# Altium footprint library connectors.PcbLib: 256 footprints (part 14 of 16)
Each footprint in its own frame and in the unit in brackets; x right, y up, seen from the top. Pads: shape width x height; smd on the part's side, far side on the other; paste and mask are expansions set on the pad; w line width, h text height; cw(c..) or ccw(c..) is an arc to the next point about the centre after c.
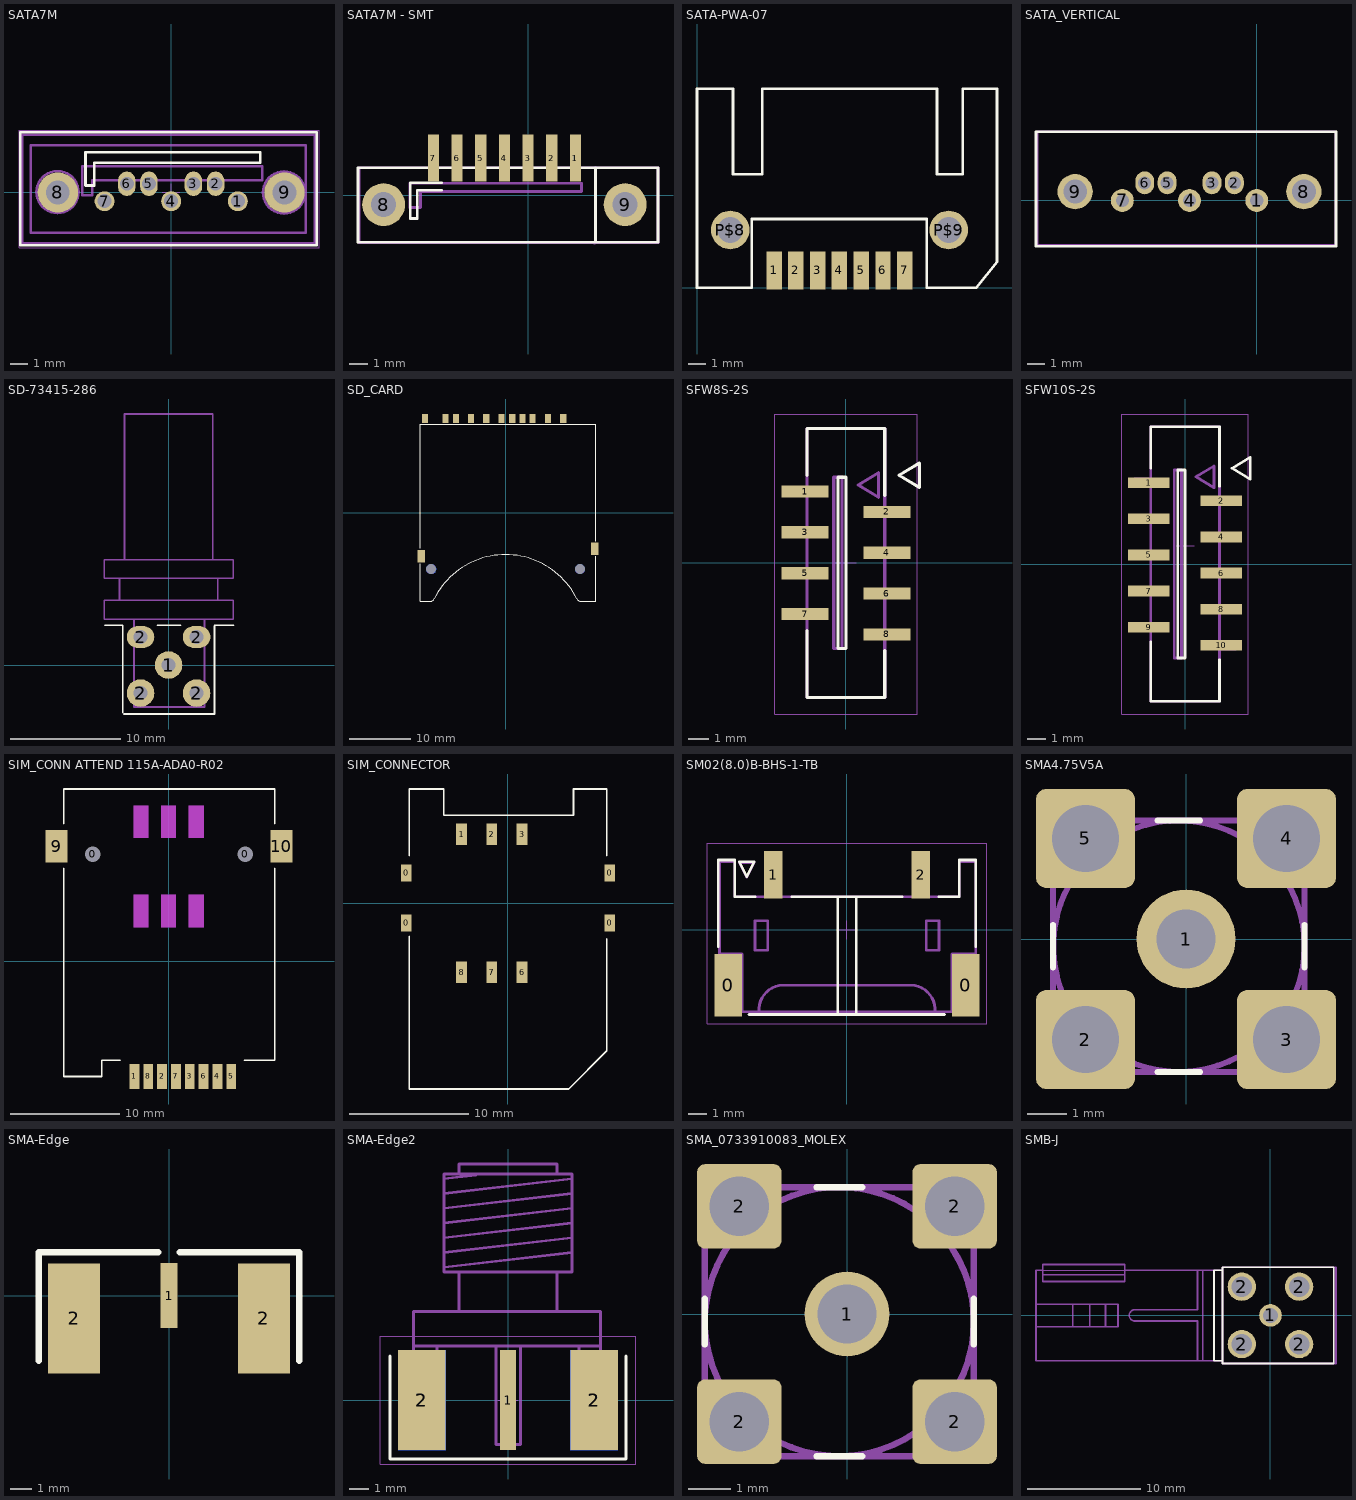
[diagram p13: the footprints below, top view; thin cyan lines are the x and y axes]

## SATA7M [mm] "Molex 47306-2001 SERIAL ATA Series 7 Way PCB Socket Through"
height 10
pads (9):
  round 1.14 hole 0.8: 1(3.81,-0.5) 4(0,-0.5) 7(-3.81,-0.5)
  oval 1x1.4 hole 0.8 mask+0.075: 2(2.54,0.5) 3(1.27,0.5) 5(-1.27,0.5) 6(-2.54,0.5)
  round 2.3 hole 1.35: 8(-6.48,0) 9(6.48,0)
Top Overlay:
  lines w0.15: -8.625,-3.025 8.325,-3.025 8.325,3.45 -8.625,3.45 -8.625,-3.025 ; -4.9,0.4 -4.4,0.4 -4.4,1.7 5.1,1.7 5.1,2.3 -4.9,2.3 -4.9,0.4
  text "." at 5,-1.7 h1.52
TopAssy 13:
  circle w0.15: c-6.5,0.025 r1.2
  circle w0.15: c6.45,0 r1.2
  lines w0.15: -4.505,0.675 -4.505,-0.15 -5.08,-0.15 -5.08,1.5 5.2,1.5 5.2,0.7 -4.505,0.7 ; -8.53,-2.9 -8.53,3.3 8.2,3.3 8.2,-2.9 -8.53,-2.9 ; -8.03,-2.3 7.7,-2.3 7.7,2.7 -8.03,2.7 -8.03,-2.3
TopCourt 15:
  lines w0.05: -0.5,0 0.5,0 ; 0,-0.5 0,0.5 ; -8.7,-3.15 8.45,-3.15 8.45,3.55 -8.7,3.55 -8.7,-3.15
3D body "471554001.step": height 8.3, standoff -2.75, extent -8.58,-3.025 8.32,3.425

## SATA7M - SMT [mm] "Molex 47080-4001 SERIAL ATA Series 7 Way PCB Socket SMT"
height 7
pads (9):
  rect 0.6x2.5 smd: 1(2.54,2) 4(-1.27,2) 7(-5.08,2)
  rect 0.6x2.5 smd mask+0.075: 2(1.27,2) 3(0,2) 5(-2.54,2) 6(-3.81,2)
  round 2.3 hole 1.35: 8(-7.75,-0.5) 9(5.21,-0.5)
Top Overlay:
  lines w0.15: -4.65,0.275 -5.95,0.275 -5.95,-1.25 -6.325,-1.25 -6.325,0.675 -4.625,0.675 ; 3.625,-2.525 3.625,1.475 ; -9.125,-2.525 -9.125,1.475 6.975,1.475 6.975,-2.525 -9.125,-2.525
  text "." at 3.325,-2.9 h1.52
TopAssy 13:
  lines w0.15: -5.775,0.175 -5.775,-0.65 -6.35,-0.65 -6.35,0.65 2.875,0.65 ; -5.775,0.2 2.875,0.2 2.875,0.625 ; 3.575,-2.575 3.625,-2.525 3.625,1.5 ; -9.075,-2.55 -9.075,1.475 6.975,1.475 6.975,-2.55 -9.075,-2.55
3D body "470804001.step": height 5.92, standoff -2.53, extent -10.54,-8.86 7,2.7

## SATA-PWA-07 [mm]
pads (9):
  rect 0.9x2.2 smd: 1(4.5,1) 2(5.77,1) 3(7.04,1) 4(8.31,1) 5(9.58,1) 6(10.85,1) 7(12.12,1)
  round 2.25 hole 1.5: P$8(1.94,3.36) P$9(14.68,3.36)
Top Overlay:
  lines w0.15: 0,0 3.2,0 3.2,4 13.4,4 13.4,0 16.3,0 17.5,1.5 17.5,11.6 15.5,11.6 15.5,6.6 14,6.6 14,11.6 3.8,11.6 3.8,6.6 2.1,6.6 2.1,11.6 0,11.6 0,0
Bottom Overlay:
  text "SATA" at 6.858,11.303 h1.02

## SATA_VERTICAL [mm]
pads (9):
  round 1.3 hole 0.74: 1(0,0) 4(-3.81,0) 7(-7.62,0)
  oval 1.07x1.3 hole 0.74: 2(-1.27,1) 3(-2.54,1) 5(-5.08,1) 6(-6.35,1)
  round 2 hole 1.35: 8(2.67,0.5) 9(-10.29,0.5)
Top Overlay:
  lines w0.15: -12.51,-2.6 -12.51,3.9 4.49,3.9 4.49,-2.6 -12.51,-2.6
BottomCourt 16:
  lines w0.15: -12.43,-2.555 -12.43,3.895 4.47,3.895 4.47,-2.555 -12.43,-2.555
Mechanical 29:
  text ".Designator" at -3.05,-0.7 h1.52
3D body "471554001.stp": height 8.43, standoff -2.62, extent -12.43,-2.555 4.47,3.895

## SD-73415-286 [mm] "FAKRA/SMB Right Angle"
pads (5):
  round 2.5 hole 1.3: 1(0,0) 2(-2.54,-2.54) 2(2.54,-2.54)
  oval 2.5x2 hole 1.3: 2(-2.54,2.54) 2(2.54,2.54)
Top Overlay:
  lines w0.15: -5.8,3.6 -4.14,3.6 -4.14,-4.34 ; -4.04,-4.44 -2.2,-4.44 4.16,-4.44 4.16,3.5 ; -1,3.6 1.1,3.6 ; 4.16,3.6 5.9,3.6
TopAssy 13:
  lines w0.15: -4.45,5.86 -4.45,7.86 ; -4,9.6 -4,22.76 4,22.76 4,9.6 ; -3.14,-3.84 -3.14,4.16 ; -3.14,-3.8 3.26,-3.8 ; 3.26,-3.84 3.26,4.16 ; 4.45,5.96 4.45,7.86 ; -5.82,4.16 -5.82,5.86 5.86,5.86 5.86,4.16 -5.82,4.16 ; -5.82,7.86 -5.82,9.56 5.86,9.56 5.86,7.86 -5.82,7.86
3D body "sma ra pcb mount molex.step": height 9.55, standoff -3.94, extent -3.275,-3.3 3.075,11.508

## SD_CARD [mm]
pads (15):
  rect 1x1.5 smd: 1(6.88,15.3) 2(4.38,15.3) 3(1.08,15.3) 4(-0.63,15.3) 5(-3.13,15.3) 6(-5.63,15.3) 7(-8.06,15.3) 8(-9.76,15.3) 9(9.38,15.3) CD(2.73,15.3) WP(-13.11,15.3)
  rect 1.2x2 smd: SH1(-13.7,-7.05) SH2(14.5,-5.85)
  round 1.6 on Bottom hole 1.6 unplated: ""(-12.09,-9.15) ""(12.1,-9.15)
Top Overlay:
  lines w0.15: -13.82,-8.3 -13.82,-14.4 -12.3,-14.4 ccw(c-12.297,-13.592) -11.6,-14 cw(c0,-19.754) 11.6,-14 ccw(c12.297,-13.592) 12.3,-14.4 14.62,-14.4 14.62,-7.1 ; -13.82,-5.8 -13.82,14.4 14.62,14.4 14.62,-4.6
TopAssy 13:

## SFW8S-2S [mm] "1.0mm ZIF FPC"
height 5.3
pads (8):
  rect 2.3x0.6 smd: 1(-2,3.5) 2(2,2.5) 3(-2,1.5) 4(2,0.5) 5(-2,-0.5) 6(2,-1.5) 7(-2,-2.5) 8(2,-3.5)
Top Overlay:
  lines w0.15: -1.9,-3.3 -1.9,-6.6 1.9,-6.6 1.9,-4.3 ; -1.9,4.3 -1.9,6.6 1.9,6.6 1.9,3.3 ; -0.4,-4.2 0,-4.2 0,4.2 -0.4,4.2 -0.4,-4.2 ; 2.6,4.3 3.6,3.7 3.6,4.9 2.6,4.3
TopAssy 13:
  lines w0.15: -1.9,-2.7 -2.8,-2.7 -2.8,-2.3 -1.9,-2.3 ; -1.9,-0.7 -2.8,-0.7 -2.8,-0.3 -1.9,-0.3 ; -1.9,1.3 -2.8,1.3 -2.8,1.7 -1.9,1.7 ; -1.9,3.3 -2.8,3.3 -2.8,3.7 -1.9,3.7 ; 1.9,-3.7 2.8,-3.7 2.8,-3.3 1.9,-3.3 ; 1.9,-1.7 2.8,-1.7 2.8,-1.3 1.9,-1.3 ; 1.9,0.3 2.8,0.3 2.8,0.7 1.9,0.7 ; 1.9,2.3 2.8,2.3 2.8,2.7 1.9,2.7 ; -1.9,-6.6 1.9,-6.6 1.9,6.6 -1.9,6.6 -1.9,-6.6 ; -0.6,-4.2 -0.6,4.2 -0.2,4.2 -0.2,-4.2 -0.6,-4.2 ; 0.6,3.82 1.6,4.42 1.6,3.22 0.6,3.82
TopCourt 15:
  lines w0.05: -0.5,0 0.5,0 ; 0,-0.5 0,0.5 ; -3.5,-7.4 3.5,-7.4 3.5,7.3 -3.5,7.3 -3.5,-7.4
3D body "sfw8s2ste1lf.stp": height 5.35, standoff 0.05, extent -2.25,-7.2 2.25,7.2

## SFW10S-2S [mm] "1.0mm ZIF FPC"
height 5.3
pads (10):
  rect 2.3x0.6 smd: 1(-2,4.5) 2(2,3.5) 3(-2,2.5) 4(2,1.5) 5(-2,0.5) 6(2,-0.5) 7(-2,-1.5) 8(2,-2.5) 9(-2,-3.5) 10(2,-4.5)
Top Overlay:
  lines w0.15: -1.9,-4.3 -1.9,-7.6 1.9,-7.6 1.9,-5.3 ; -1.9,5.3 -1.9,7.6 1.9,7.6 1.9,4.3 ; -0.4,-5.2 -0.4,5.2 0,5.2 0,-5.2 -0.4,-5.2 ; 2.6,5.3 3.6,5.9 3.6,4.7 2.6,5.3
TopAssy 13:
  lines w0.15: -1.9,-3.7 -2.8,-3.7 -2.8,-3.3 -1.9,-3.3 ; -1.9,-1.7 -2.8,-1.7 -2.8,-1.3 -1.9,-1.3 ; -1.9,0.3 -2.8,0.3 -2.8,0.7 -1.9,0.7 ; -1.9,2.3 -2.8,2.3 -2.8,2.7 -1.9,2.7 ; -1.9,4.3 -2.8,4.3 -2.8,4.7 -1.9,4.7 ; 1.9,-4.7 2.8,-4.7 2.8,-4.3 1.9,-4.3 ; 1.9,-2.7 2.8,-2.7 2.8,-2.3 1.9,-2.3 ; 1.9,-0.7 2.8,-0.7 2.8,-0.3 1.9,-0.3 ; 1.9,1.3 2.8,1.3 2.8,1.7 1.9,1.7 ; 1.9,3.3 2.8,3.3 2.8,3.7 1.9,3.7 ; -1.9,-7.6 -1.9,7.6 1.9,7.6 1.9,-7.6 -1.9,-7.6 ; -0.6,-5.2 -0.2,-5.2 -0.2,5.2 -0.6,5.2 -0.6,-5.2 ; 0.6,4.82 1.6,4.22 1.6,5.42 0.6,4.82
TopCourt 15:
  lines w0.05: -0.5,1 0.5,1 ; 0,0.5 0,1.5 ; -3.5,-8.3 -3.5,8.3 3.5,8.3 3.5,-8.3 -3.5,-8.3
3D body "sfw10s2ste1lf.stp": height 5.35, standoff 0.05, extent -2.25,-8.2 2.25,8.2

## SIM_CONN ATTEND 115A-ADA0-R02 [mm] "47553-0001 MOLEX SIM_CONNECTOR -6pin"
height 2
pads (12):
  round 1.3 hole 1.4 unplated: 0(-7,9.825) 0(7,9.825)
  rect 0.9x2.3 smd: 1(-3.175,-10.575) 2(-0.635,-10.575) 3(1.905,-10.575) 4(4.445,-10.575) 5(5.715,-10.575) 6(3.175,-10.575) 7(0.635,-10.575) 8(-1.905,-10.575)
  rect 2x3 smd: 9(-10.325,10.575) 10(10.325,10.575)
Top Overlay:
  lines w0.15: -9.675,8.525 -9.675,-10.575 -6.175,-10.575 -6.175,-9.075 -4.475,-9.075 ; -9.675,12.625 -9.675,15.825 9.725,15.825 9.725,12.625 ; 6.925,-9.075 9.725,-9.075 9.725,8.525
TopAssy 13 keep-out:
  region: -1.875,11.325 -1.875,14.325 -3.275,14.325 -3.275,11.325
  region: 0.665,11.325 0.665,14.325 -0.735,14.325 -0.735,11.325
  region: 3.205,11.325 3.205,14.325 1.805,14.325 1.805,11.325
  region: -1.875,3.125 -1.875,6.125 -3.275,6.125 -3.275,3.125
  region: 0.665,3.125 0.665,6.125 -0.735,6.125 -0.735,3.125
  region: 3.205,3.125 3.205,6.125 1.805,6.125 1.805,3.125
3D body "User Library-115A-ADA0-R02.step": height 1.8, standoff 0, extent -10.45,-11.075 10.5,15.925

## SIM_CONNECTOR [mm] "SD-47308-0001 MOLEX SIM_CONNECTOR 6-PIN"
height 2
pads (10):
  rect 0.9x1.4 smd: 0(-8.55,-1.65) 0(-8.55,2.55) 0(8.55,-1.65) 0(8.55,2.55)
  rect 0.9x1.8 smd: 1(-3.9,5.8) 2(-1.36,5.8) 3(1.18,5.8) 6(1.18,-5.8) 7(-1.36,-5.8) 8(-3.9,-5.8)
Top Overlay:
  lines w0.15: -8.3,-2.8 -8.3,-15.6 5.1,-15.6 8.3,-12.4 8.3,-3 ; -8.3,4 -8.3,9.6 -5.4,9.6 -5.4,7.4 5.5,7.4 5.5,9.6 8.3,9.6 8.3,4
3D body "User Library-Sim Card Holder.step": height 1.8, standoff 0, extent -8.2,-6.75 8.2,9.55

## SM02(8.0)B-BHS-1-TB [mm] "8 mm Contact Pitch, Board-to-Cable, JST"
height 3
pads (4):
  rect 1.5x3.4 smd: 0(-6.45,-3) 0(6.45,-3)
  rect 1x2.6 smd: 1(-4,3) 2(4,3)
Top Overlay:
  lines w0.15: -7,-0.9 -7,3.8 -6.1,3.8 -6.1,1.8 -5,1.8 ; -5.325,-4.6 5.3,-4.6 ; -3,1.8 3,1.8 ; -0.5,-4.6 -0.5,1.8 ; 0.5,-4.6 0.5,1.8 ; 5,1.8 6.1,1.8 6.1,3.8 7,3.8 7,-0.9 ; -5.85,3.7 -5.45,2.9 -5.05,3.7 -5.85,3.7
TopAssy 13:
  lines w0.15: -4.781,-4.448 cw(c-3.443,-4.341) -3.5,-3 3.5,-3 cw(c3.443,-4.341) 4.781,-4.448 ; -4.253,1.8 -4.253,4.008 -3.725,4.008 -3.725,1.8 ; 3.747,1.8 3.747,4.008 4.275,4.008 4.275,1.8 ; -6.925,-4.45 7,-4.45 ; -6.925,-4.45 -6.925,3.7 -6.1,3.7 -6.1,1.8 6.1,1.8 6.1,3.7 7,3.7 7,-4.45 ; -6.925,-4.45 -6.925,-1.3 -5.7,-1.3 -5.7,-4.45 -6.925,-4.45 ; 7,-4.45 5.7,-4.45 5.7,-1.3 7,-1.3 7,-4.45 ; -5.847,3.667 -5.047,3.667 -5.447,2.867 -5.847,3.667 ; -5,-1.1 -4.3,-1.1 -4.3,0.5 -5,0.5 -5,-1.1 ; 4.3,-1.1 4.3,0.5 5,0.5 5,-1.1 4.3,-1.1
TopCourt 15:
  lines w0.05: -0.5,0 0.5,0 ; 0,-0.5 0,0.5 ; -7.6,-5.1 -7.6,4.7 7.6,4.7 7.6,-5.1 -7.6,-5.1
3D body "SM02(8.0)B-BHS-1-TB.STEP": height 3.25, standoff 0.05, extent -7,-4.5 7,4.1

## SMA4.75V5A [mm] "Connector; RF Coaxial, SMA, SM; 5 Position; Vertical"
height 10.3
pads (5):
  round 2.5 hole 1.5: 1(0,0)
  rrect20% 2.5x2.5 hole 1.7: 2(-2.54,-2.54) 3(2.54,-2.54) 4(2.54,2.54) 5(-2.54,2.54)
Top Overlay:
  lines w0.15: -3.355,-0.72 -3.355,0.36 ; -0.72,-3.355 0.36,-3.355 ; -0.72,2.995 0.36,2.995 ; 2.995,-0.72 2.995,0.36
TopAssy 13:
  circle w0.15: c-0.18,-0.18 r3.175
  lines w0.15: -3.355,-3.355 2.995,-3.355 2.995,2.995 -3.355,2.995 -3.355,-3.355
3D body "SMA_connector.STEP": height 3.49, standoff -11.9, extent -4,-5.1 16.5,5.1

## SMA-Edge [mil] "SMA Edge connector"
height 275.59
pads (3):
  rect 30x118.11 smd paste-196.85: 1(0,0)
  rect 95x200 smd paste-196.85: 2(-172.5,-41.34) 2(172.5,-41.34)
Top Overlay:
  lines w11.81: -236.22,-118.11 -236.22,78.74 -19.68,78.74 ; 19.68,78.74 236.22,78.74 236.22,-118.11
Bottom Solder:
  rectangle: -223.22,-144.88 -121.65,61.42
  rectangle: 120.87,-145.67 223.62,62.6
3D body "User Library-SMA_PCB_EDGE_142-0701-851.STEP": height 160.83, standoff -150.98, extent -187.4,-108.27 187.4,436.22

## SMA-Edge2 [mil] "SMA Edge connector 732511150 Molex"
height 275.59
pads (5):
  rect 31.5x200 smd paste-196.85: 1(0,0)
  rect 95x200 smd paste-196.85: 2(-172.5,0) 2(172.5,0)
  rect 95x200 smd far side paste-196.85: 2(-172.5,0) 2(172.5,0)
Top Overlay:
  lines w5.91: -236.22,88.58 -236.22,-118.11 236.22,-118.11 236.22,88.58
Bottom Solder:
  rectangle: -223.22,-103.54 -121.65,102.76
  rectangle: 120.87,-104.33 223.62,103.94
TopAssy 13:
  lines w5.91: -127.95,265.75 127.95,295.28 ; -127.95,295.28 127.95,324.8 ; -127.95,324.8 127.95,354.33 ; -127.95,354.33 127.95,383.86 ; -127.95,383.86 127.95,413.39 ; -127.95,413.39 127.95,442.91 ; -127.95,442.91 -63.98,450.3 ; -98.43,177.17 -98.43,255.91 ; -98.43,452.76 -98.43,472.44 98.43,472.44 98.43,452.76 ; -24.35,108.27 -24.35,-88.58 24.86,-88.58 24.86,108.27 ; 98.43,177.17 98.43,255.91 ; 141.73,108.27 141.73,-88.58 185.04,-88.58 185.04,108.27 ; -188.98,108.27 185.04,108.27 ; -188.98,108.27 -188.98,177.17 185.04,177.17 185.04,108.27 ; -188.98,108.27 -141.73,108.27 -141.73,-88.58 -188.98,-88.58 -188.98,108.27 ; -127.95,255.91 -127.95,452.76 127.95,452.76 127.95,255.91 -127.95,255.91
TopCourt 15:
  lines w1.97: -19.68,0 19.68,0 ; 0,-19.69 0,19.68 ; -255.91,-127.95 -255.91,127.95 255.91,127.95 255.91,-127.95 -255.91,-127.95
3D body "732511150.stp": height 171.75, standoff -140.25, extent -187.99,-84.15 187.01,477.85

## SMA_0733910083_MOLEX [mm] "Connector; RF Coaxial, SMA, SM; 5 Position; Vertical"
height 10.3
pads (5):
  round 2 hole 1.4: 1(0,0)
  rrect20% 2x2 hole 1.4: 2(-2.54,-2.54) 2(-2.54,2.54) 2(2.54,-2.54) 2(2.54,2.54)
Top Overlay:
  lines w0.15: -3.355,-0.72 -3.355,0.36 ; -0.72,-3.355 0.36,-3.355 ; -0.72,2.995 0.36,2.995 ; 2.995,-0.72 2.995,0.36
TopAssy 13:
  circle w0.15: c-0.18,-0.18 r3.175
  lines w0.15: -3.355,-3.355 2.995,-3.355 2.995,2.995 -3.355,2.995 -3.355,-3.355
3D body "733910083.stp": height 3, standoff -10.5, extent -11.625,-3.175 3.175,3.175

## SMB-J [mm]
height 9
pads (5):
  round 2 hole 1.3: 1(0,0)
  round 2.5 hole 1.8: 2(-2.54,-2.54) 2(-2.54,2.54) 2(2.54,-2.54) 2(2.54,2.54)
Top Overlay:
  lines w0.15: -4.25,-4 -5,-4 -5,4 -4.25,4 ; -4.25,-4.25 5.6,-4.25 5.6,4.25 -4.25,4.25 -4.25,-4.25
TopAssy 13:
  lines w0.15: -20.75,-1 -13.5,-1 -13.5,1 -20.75,1 ; -20.2,4 -20.75,4 -20.75,-4 -4.25,-4 ; -20.15,3.6 -12.9,3.6 ; -17.5,-1 -17.5,1 ; -16,-1 -16,1 ; -14.6,-1 -14.6,1 ; -12.9,4 -4.25,4 ; -6.45,-4 -6.45,-0.5 -12,-0.5 cw(c-12,0) -12,0.5 -6.45,0.5 -6.45,4 ; -6,-4 -6,3.9 ; -5,-4 -5,4 ; 5.6,-4.25 5.6,4.25 ; -20.15,3 -12.9,3 -12.9,4.5 -20.15,4.5 -20.15,3 ; -4.25,-4.25 5.8,-4.25 5.8,4.25 -4.25,4.25 -4.25,-4.25
TopCourt 15:
  lines w0.05: -4.25,-4 -20.75,-4 -20.75,4 -4.25,4 ; -4.25,-4.25 -4.25,4.25 5.8,4.25 5.8,-4.25 -4.25,-4.25
3D body "734040812.stp": height 11.29, standoff -2.75, extent -20.529,-4 5.4,4